# Altium footprint library MPBoard.PcbLib: 123 footprints (part 2 of 8)
Each footprint in its own frame and in the unit in brackets; x right, y up, seen from the top. Pads: shape width x height; smd on the part's side, far side on the other; paste and mask are expansions set on the pad; w line width, h text height; cw(c..) or ccw(c..) is an arc to the next point about the centre after c.
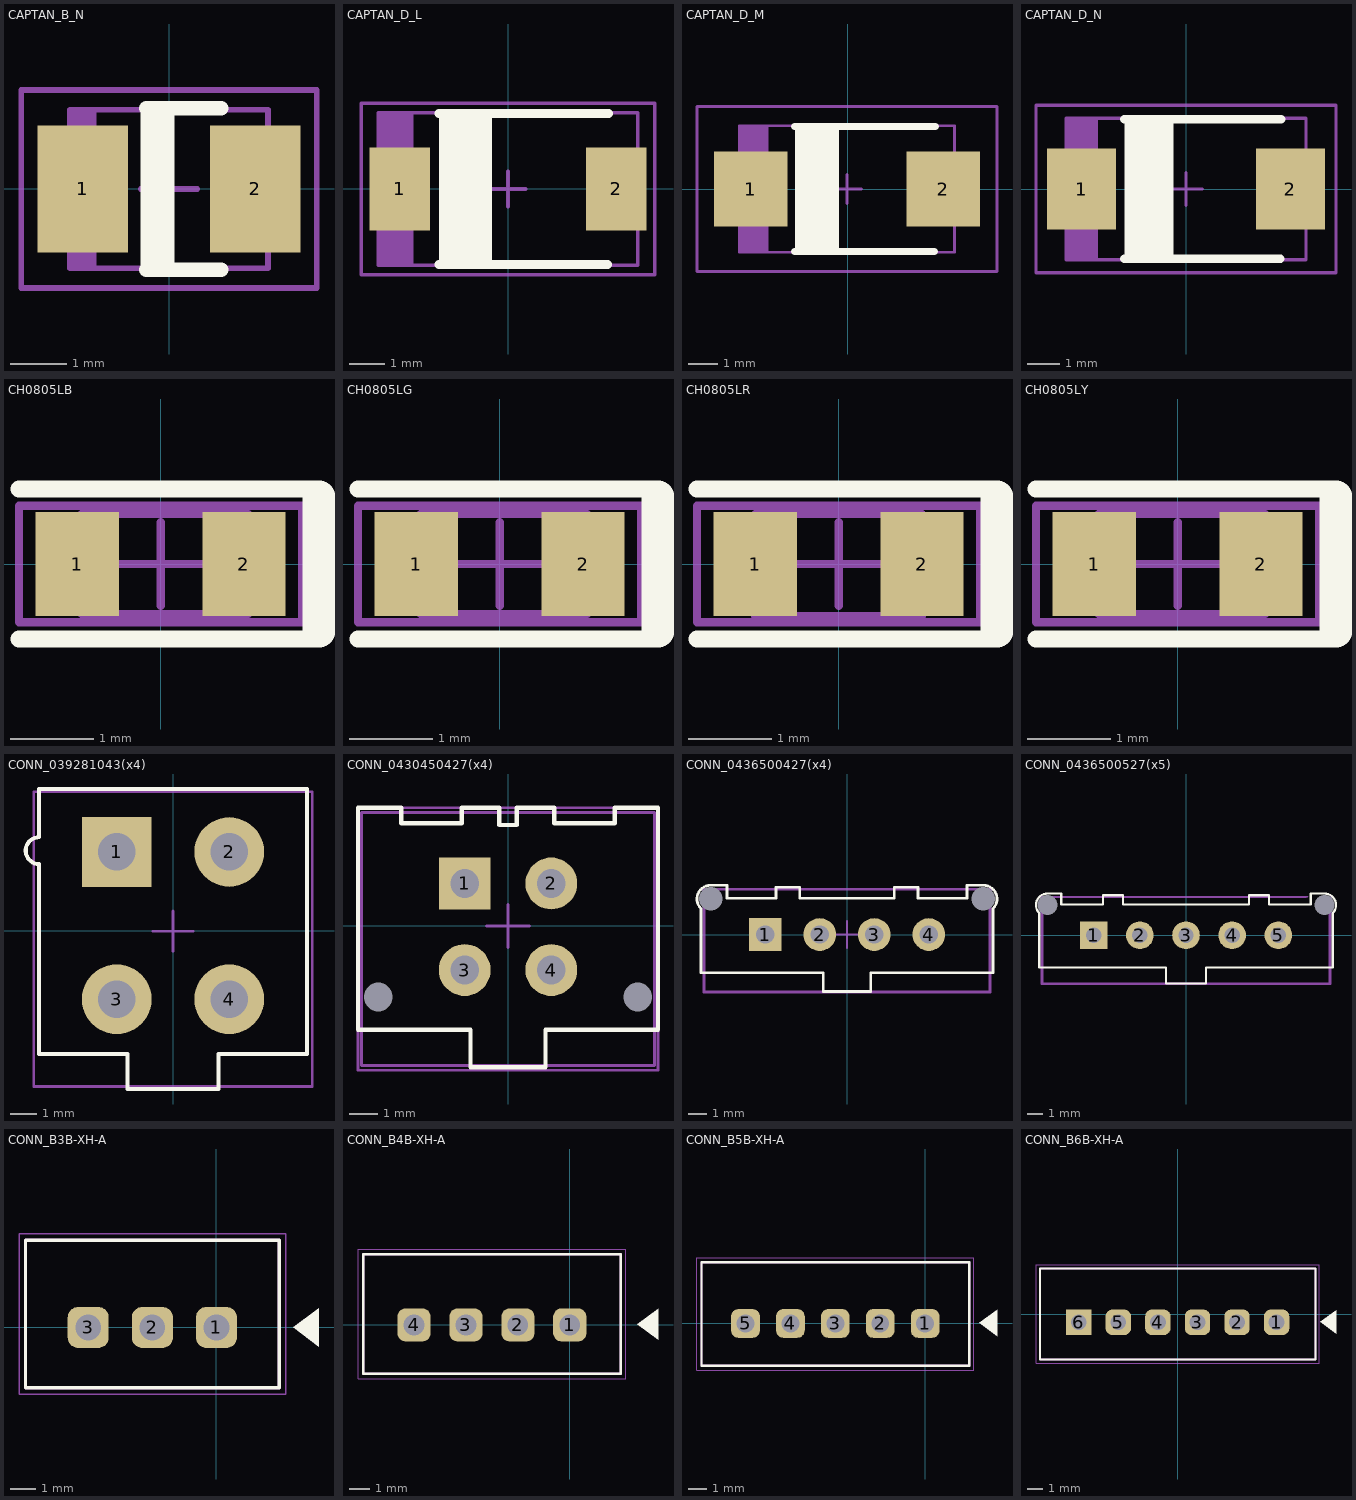
[diagram p1: the footprints below, top view; thin cyan lines are the x and y axes]

## CAPTAN_B_N [mm]
height 1.9
pads (2):
  rect 1.6x2.25 smd: 1(-1.525,0) 2(1.525,0)
Top Overlay:
  rectangle: -0.5,-1.45 0.1,1.425
  lines w0.254: -0.4,-1.425 0.925,-1.425 ; -0.4,1.425 0.925,1.425
Top Component Outline:
  rectangle: -1.75,-1.4 -1.279,1.4
  lines w0.1: -1.75,-1.4 1.75,-1.4 1.75,1.4 -1.75,1.4 -1.75,-1.4
Top Courtyard:
  lines w0.1: -0.5,0 0.5,0 ; 0,-0.5 0,0.5 ; -2.61,-1.75 2.61,-1.75 2.61,1.75 -2.61,1.75 -2.61,-1.75
3D body "tantal_case_B.step": height 1.9, standoff 0, extent -1.75,-1.4 1.75,1.4

## CAPTAN_D_L [mm]
height 2.9
pads (2):
  rect 1.7x2.35 smd: 1(-3.05,0) 2(3.05,0)
Top Overlay:
  rectangle: -1.95,-2.125 -0.45,2.125
  lines w0.254: -1.95,-2.125 2.8,-2.125 ; -1.95,2.125 2.825,2.125
Top Component Outline:
  rectangle: -3.65,-2.15 -2.668,2.15
  lines w0.1: -3.65,-2.15 -3.65,2.15 3.65,2.15 3.65,-2.15 -3.65,-2.15
Top Courtyard:
  lines w0.1: -0.5,0 0.5,0 ; 0,-0.5 0,0.5 ; -4.13,-2.42 -4.13,2.42 4.13,2.42 4.13,-2.42 -4.13,-2.42
3D body "tantal_case_D.step": height 2.8, standoff 0, extent -3.65,-2.15 3.65,2.15

## CAPTAN_D_M [mm]
height 2.9
pads (2):
  rect 2.5x2.55 smd: 1(-3.3,0) 2(3.25,0)
Top Overlay:
  rectangle: -1.8,-2.125 -0.3,2.125
  lines w0.254: -1.8,-2.125 2.95,-2.125 ; -1.8,2.125 2.975,2.125
Top Component Outline:
  rectangle: -3.675,-2.15 -2.693,2.15
  lines w0.1: -3.675,-2.15 -3.675,2.15 3.625,2.15 3.625,-2.15 -3.675,-2.15
Top Courtyard:
  lines w0.1: -0.525,0 0.475,0 ; -0.025,-0.5 -0.025,0.5 ; -5.125,-2.8 -5.125,2.8 5.075,2.8 5.075,-2.8 -5.125,-2.8
3D body "tantal_case_D.step": height 2.8, standoff 0, extent -3.65,-2.15 3.65,2.15

## CAPTAN_D_N [mm]
height 2.9
pads (2):
  rect 2.1x2.45 smd: 1(-3.175,0) 2(3.175,0)
Top Overlay:
  rectangle: -1.875,-2.125 -0.375,2.125
  lines w0.254: -1.875,-2.125 2.875,-2.125 ; -1.875,2.125 2.9,2.125
Top Component Outline:
  rectangle: -3.65,-2.15 -2.668,2.15
  lines w0.1: -3.65,-2.15 3.65,-2.15 3.65,2.15 -3.65,2.15 -3.65,-2.15
Top Courtyard:
  lines w0.1: -0.5,0 0.5,0 ; 0,-0.5 0,0.5 ; -4.56,-2.55 4.56,-2.55 4.56,2.55 -4.56,2.55 -4.56,-2.55
3D body "tantal_case_D.step": height 2.8, standoff 0, extent -3.65,-2.15 3.65,2.15

## CH0805LB [mm]
height 1
pads (2):
  rect 1x1.25 smd: 1(-1,0) 2(1,0)
Top Overlay:
  lines w0.2: -1.7,-0.9 1.9,-0.9 ; -1.7,0.9 1.9,0.9
  lines w0.4: 1.9,-0.8 1.9,0.8
Top Component Outline:
  lines w0.1: -0.949,-0.6 -0.949,0.6 1.05,0.6 1.05,-0.6 -0.949,-0.6
Top Courtyard:
  lines w0.1: -0.5,0 0.5,0 ; 0,-0.5 0,0.5 ; -1.7,-0.7 1.7,-0.7 1.7,0.7 -1.7,0.7 -1.7,-0.7
3D body "everlight-17-21-0805LED-BLUE.step": height 1.1, standoff -0.01, extent -0.95,-0.625 1.05,0.625

## CH0805LG [mm]
height 1
pads (2):
  rect 1x1.25 smd: 1(-1,0) 2(1,0)
Top Overlay:
  lines w0.2: -1.7,-0.9 1.9,-0.9 ; -1.7,0.9 1.9,0.9
  lines w0.4: 1.9,-0.8 1.9,0.8
Top Component Outline:
  lines w0.1: -0.949,-0.6 1.05,-0.6 1.05,0.6 -0.949,0.6 -0.949,-0.6
Top Courtyard:
  lines w0.1: -0.5,0 0.5,0 ; 0,-0.5 0,0.5 ; -1.7,-0.7 -1.7,0.7 1.7,0.7 1.7,-0.7 -1.7,-0.7
3D body "everlight-17-21-0805LED-GREEN.step": height 1.1, standoff -0.01, extent -0.95,-0.625 1.05,0.625

## CH0805LR [mm]
height 1
pads (2):
  rect 1x1.25 smd: 1(-1,0) 2(1,0)
Top Overlay:
  lines w0.2: -1.7,-0.9 1.9,-0.9 ; -1.7,0.9 1.9,0.9
  lines w0.4: 1.9,-0.8 1.9,0.8
Top Component Outline:
  lines w0.1: -1,-0.625 1,-0.625 1,0.6 -1,0.6 -1,-0.625
Top Courtyard:
  lines w0.1: -0.5,0 0.5,0 ; 0,-0.5 0,0.5 ; -1.7,-0.7 1.7,-0.7 1.7,0.7 -1.7,0.7 -1.7,-0.7
3D body "everlight-17-21-0805LED-red.step": height 1.1, standoff -0.01, extent -1,-0.635 1,0.615

## CH0805LY [mm]
height 1
pads (2):
  rect 1x1.25 smd: 1(-1,0) 2(1,0)
Top Overlay:
  lines w0.2: -1.7,-0.9 1.9,-0.9 ; -1.7,0.9 1.9,0.9
  lines w0.4: 1.9,-0.8 1.9,0.8
Top Component Outline:
  lines w0.1: -0.949,-0.6 1.05,-0.6 1.05,0.6 -0.949,0.6 -0.949,-0.6
Top Courtyard:
  lines w0.1: -0.5,0 0.5,0 ; 0,-0.5 0,0.5 ; -1.7,-0.7 -1.7,0.7 1.7,0.7 1.7,-0.7 -1.7,-0.7
3D body "everlight-17-21-0805LED-YELLOW.step": height 1.1, standoff -0.01, extent -0.95,-0.625 1.05,0.625

## CONN_039281043(x4) [mm] "Molex"
pads (4):
  rect 2.6x2.6 hole 1.4: 1(-2.1,2.95)
  round 2.6 hole 1.4: 2(2.1,2.95) 3(-2.1,-2.55) 4(2.1,-2.55)
Top Overlay:
  lines w0.15: -5,-4.6 -5,2.5 cw(c-5,3) -5,3.5 -5,5.3 5,5.3 5,-4.6 1.7,-4.6 1.7,-5.9 -1.7,-5.9 -1.7,-4.6 -5,-4.6
Top Component Outline:
  lines w0.1: -5.2,-5.805 -5.2,5.2 5.2,5.2 5.2,-5.805 -5.2,-5.805
Top Courtyard:
  lines w0.1: -0.75,-0.005 0.75,-0.005 ; 0,-0.755 0,0.745 ; -5.2,-5.805 5.2,-5.805 5.2,5.2 -5.2,5.2 -5.2,-5.805
3D body "039281043.stp": height 12.8, standoff -3.5, extent -5.2,-5.805 5.2,5.195

## CONN_0430450427(x4) [mm] "Molex"
pads (6):
  round 0 hole 1 unplated: 0(-4.5,-2.47) 0(4.5,-2.47)
  rect 1.8x1.8 hole 1: 1(-1.5,1.47)
  round 1.8 hole 1: 2(1.5,1.47) 3(-1.5,-1.53) 4(1.5,-1.53)
Top Overlay:
  lines w0.15: -5.2,-3.6 -2.6,-3.6 -1.3,-3.6 -1.3,-4.9 1.3,-4.9 1.3,-3.6 2.6,-3.6 5.2,-3.6 5.2,4.095 3.7,4.095 3.7,3.56 1.6,3.56 1.6,4.095 0.3,4.095 0.3,3.5 0,3.5 -0.3,3.5 -0.3,4.095 -1.6,4.095 -1.6,3.56 -3.7,3.56 -3.7,4.095 -5.2,4.095 -5.2,-3.6
Top Component Outline:
  lines w0.1: -5.075,-4.835 -5.075,3.935 5.08,3.935 5.08,-4.835 -5.075,-4.835
Top Courtyard:
  lines w0.1: -0.75,-0.005 0.75,-0.005 ; 0,-0.755 0,0.745 ; -5.2,-5.005 5.2,-5.005 5.2,4.095 -5.2,4.095 -5.2,-5.005
3D body "430450427.stp": height 9.95, standoff -3.14, extent -5.075,-4.835 5.075,3.935

## CONN_0436500427(x4) [mm] "Molex"
pads (6):
  round 0 hole 1.3 unplated: 0(-7.5,1.96) 0(7.5,1.96)
  rect 1.8x1.8 hole 1: 1(-4.5,0)
  round 1.8 hole 1: 2(-1.5,0) 3(1.5,0) 4(4.5,0)
Top Overlay:
  lines w0.15: -8.03,-2.1 -1.3,-2.1 -1.3,-3.135 1.3,-3.135 1.3,-2.1 8.03,-2.1 8.03,1.43 ccw(c7.5,1.96) 7.5,2.71 6.6,2.71 6.6,2 3.9,2 3.9,2.6 2.6,2.6 2.6,2 -2.6,2 -2.6,2.6 -3.9,2.6 -3.9,2 -6.6,2 -6.6,2.71 -7.5,2.71 ccw(c-7.5,1.96) -8.03,1.43 -8.03,-2.1
Top Component Outline:
  lines w0.1: -7.825,-3.135 7.825,-3.135 7.825,2.47 -7.825,2.47 -7.825,-3.135
Top Courtyard:
  lines w0.1: -0.75,0 0.75,0 ; 0,-0.75 0,0.75 ; -7.9,-3.2 -7.9,2.5 7.9,2.5 7.9,-3.2 -7.9,-3.2
3D body "436500427.stp": height 9.95, standoff -3.13, extent -7.825,-3.135 7.825,2.47

## CONN_0436500527(x5) [mm] "Molex"
pads (7):
  round 0 hole 1.3 unplated: 0(-9,1.96) 0(9,1.96)
  rect 1.8x1.8 hole 1: 1(-6,0)
  round 1.8 hole 1: 2(-3,0) 3(0,0) 4(3,0) 5(6,0)
Top Overlay:
  lines w0.15: -9.53,-2.1 -9.53,1.43 cw(c-9,1.96) -9,2.71 -8.1,2.71 -8.1,2 -5.4,2 -5.4,2.6 -4.1,2.6 -4.1,2 4.1,2 4.1,2.6 5.4,2.6 5.4,2 8.1,2 8.1,2.71 9,2.71 cw(c9,1.96) 9.53,1.43 9.53,-2.1 1.3,-2.1 1.3,-3.135 -1.3,-3.135 -1.3,-2.1 -9.53,-2.1
Top Component Outline:
  lines w0.1: 7.825,2.47 -9.32,2.47 -9.32,-3.135 9.325,-3.135 9.325,2.47
Top Courtyard:
  lines w0.1: -0.75,0 0.75,0 ; 0,-0.75 0,0.75 ; 7.9,2.5 -9.4,2.5 -9.4,-3.2 9.4,-3.2 9.4,2.5
3D body "436500527.stp": height 9.95, standoff -3.13, extent -9.32,-3.135 9.32,2.47

## CONN_B3B-XH-A [mm] "JST"
height 7
pads (3):
  rrect50% 1.6x1.6 hole 1: 1(0,0) 2(-2.5,0) 3(-5,0)
Top Overlay:
  region: 4,-0.75 3,0 4,0.75
  lines w0.127: -7.45,-2.35 -7.45,3.4 2.45,3.4 2.45,-2.35 -7.45,-2.35
Mechanical 13:
  lines w0.127: -7.45,-2.35 -7.45,3.4 2.45,3.4 2.45,-2.35 -7.45,-2.35
Mechanical 15:
  lines w0.05: -7.7,-2.6 2.7,-2.6 2.7,3.65 -7.7,3.65 -7.7,-2.6
3D body "step_temp.STEP": height 7, standoff -3.4, extent -7.45,-2.35 2.45,3.4

## CONN_B4B-XH-A [mm] "JST"
pads (4):
  rrect50% 1.6x1.6 hole 1: 1(0,0) 2(-2.5,0) 3(-5,0) 4(-7.5,0)
Top Overlay:
  region: 4.25,-0.725 3.25,0.025 4.25,0.775
  lines w0.127: -9.95,-2.35 -9.95,3.4 2.45,3.4 2.45,-2.35 -9.95,-2.35
Mechanical 13:
  lines w0.127: -9.95,-2.35 -9.95,3.4 2.45,3.4 2.45,-2.35 -9.95,-2.35
Mechanical 15:
  lines w0.05: -10.2,-2.6 2.7,-2.6 2.7,3.65 -10.2,3.65 -10.2,-2.6
3D body "B4B-XH-A-LF-SN.STEP": height 7.01, standoff -3.39, extent -9.95,-2.35 2.45,3.4

## CONN_B5B-XH-A [mm] "JST"
pads (5):
  rrect50% 1.6x1.6 hole 1: 1(0,0) 2(-2.5,0) 3(-5,0) 4(-7.5,0) 5(-10,0)
Top Overlay:
  region: 4,-0.725 3,0.025 4,0.775
  lines w0.127: -12.45,-2.35 -12.45,3.4 2.45,3.4 2.45,-2.35 -12.45,-2.35
Mechanical 13:
  lines w0.127: -12.45,-2.35 -12.45,3.4 2.45,3.4 2.45,-2.35 -12.45,-2.35
Mechanical 15:
  lines w0.05: -12.7,-2.6 2.7,-2.6 2.7,3.65 -12.7,3.65 -12.7,-2.6
3D body "step_temp.STEP": height 7, standoff -3.4, extent -12.45,-2.35 2.45,3.4

## CONN_B6B-XH-A [mm] "JST"
pads (6):
  rrect50% 1.6x1.6 hole 1: 1(6.25,-0.525) 2(3.75,-0.525) 3(1.25,-0.525) 4(-1.25,-0.525) 5(-3.75,-0.525)
  rect 1.6x1.6 hole 1: 6(-6.25,-0.525)
Top Overlay:
  region: 10,-1.25 9,-0.5 10,0.25
  lines w0.127: -8.7,-2.875 8.7,-2.875 8.7,2.875 -8.7,2.875 -8.7,-2.875
Mechanical 13:
  lines w0.127: -8.7,-2.875 8.7,-2.875 8.7,2.875 -8.7,2.875 -8.7,-2.875
Mechanical 15:
  lines w0.05: -8.95,-3.125 -8.95,3.125 8.95,3.125 8.95,-3.125 -8.95,-3.125
3D body "step_temp.STEP": height 7, standoff -3.4, extent -8.7,-2.875 8.7,2.875